# Altium footprint library Cty1.PcbLib: 870 footprints (part 20 of 55)
Each footprint in its own frame and in the unit in brackets; x right, y up, seen from the top. Pads: shape width x height; smd on the part's side, far side on the other; paste and mask are expansions set on the pad; w line width, h text height; cw(c..) or ccw(c..) is an arc to the next point about the centre after c.
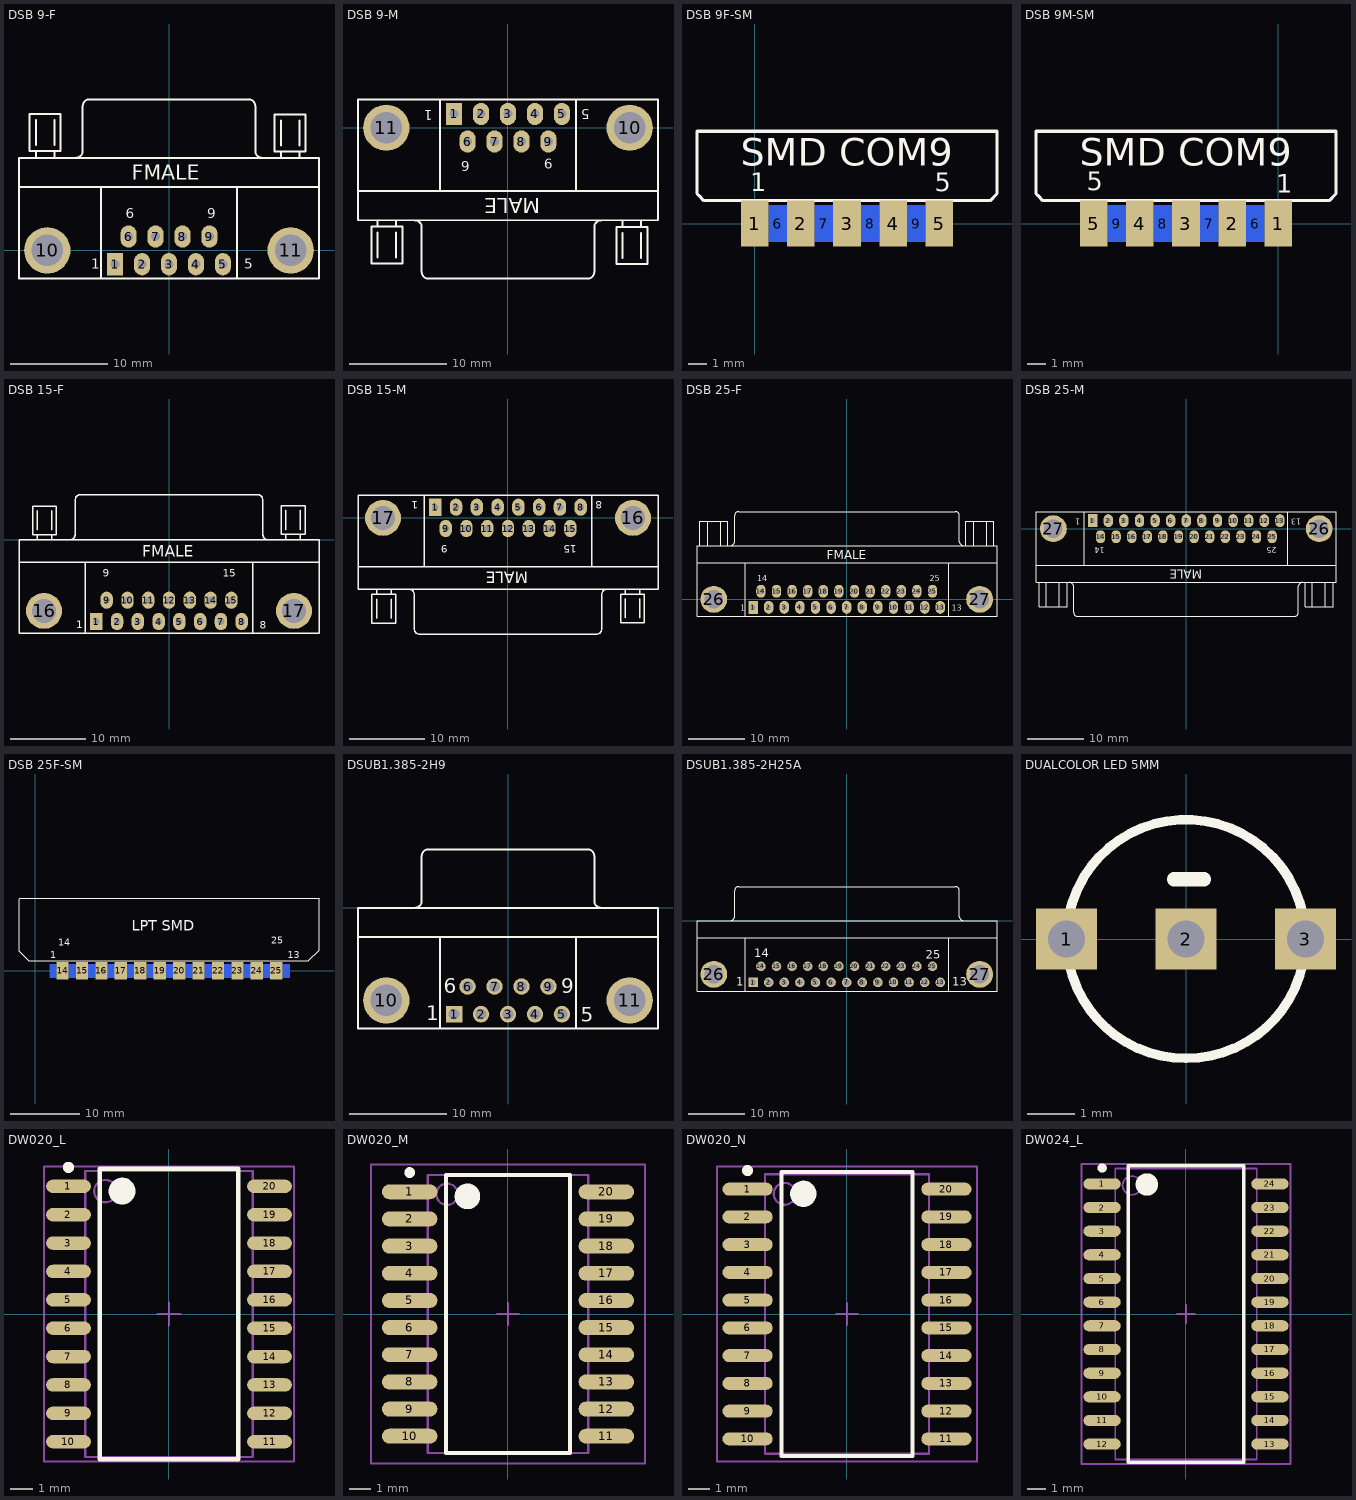
[diagram p19: the footprints below, top view; thin cyan lines are the x and y axes]

## DSB 9-F [mil] "COM FMALE - D Subminiature; 9 Position; Right Angle; Pitch 1.385 mm"
height 501.97
pads (11):
  rect 65x90 hole 35: 1(-218.11,-55.91)
  oval 65x90 hole 35: 2(-109.06,-55.91) 3(0,-55.91) 4(109.06,-55.91) 5(218.11,-55.91) 6(-163.58,55.91) 7(-54.53,55.91) 8(54.53,55.91) 9(163.58,55.91)
  round 187.4 hole 128.35: 10(-491.93,0) 11(491.93,0)
Top Overlay:
  lines w7.87: -606.3,255.91 606.3,255.91 ; -376.38,374.21 ccw(c-376.38,401.57) -349.02,401.57 -349.02,582.68 ; -348.82,582.87 cw(c-321.46,582.87) -321.46,610.24 321.46,610.24 cw(c321.46,582.87) 348.82,582.87 ; -275.59,-114.17 -275.59,255.91 ; 275.59,-114.17 275.59,255.91 ; 349.02,582.68 349.02,401.57 ccw(c376.38,401.57) 376.38,374.21 ; -606.3,-114.17 -606.3,374.02 606.3,374.02 606.3,-114.17 -606.3,-114.17
  lines w8: -538,376.02 -538,401.02 ; -538,426.02 -538,526.02 ; -463,376.02 -463,401.02 ; -463,426.02 -463,526.02 ; 452,374.02 452,399.02 ; 452,424.02 452,524.02 ; 527,374.02 527,399.02 ; 527,424.02 527,524.02 ; -563,401.02 -438,401.02 -438,551.02 -563,551.02 -563,401.02 ; 427,399.02 552,399.02 552,549.02 427,549.02 427,399.02
  text "1" at -315,-75 h40
  text "5" at 305,-75 h40
  text "9" at 155,130 h40
  text "6" at -175,130 h40
  text "FMALE" at -150,285 h60
3D body "SW3dPS-9-PIN_DSUB-1.STEP": height 494.6, standoff -124.4, extent -604.5,-138 608.5,613

## DSB 9-M [mil] "COM MALE D Subminiature; 9 Position; Right Angle; Pitch 1.385 mm"
height 501.97
pads (11):
  rect 65x90 hole 35: 1(-218.11,55.91)
  oval 65x90 hole 35: 2(-109.05,55.91) 3(0,55.91) 4(109.06,55.91) 5(218.11,55.91) 6(-163.58,-55.91) 7(-54.53,-55.91) 8(54.53,-55.91) 9(163.58,-55.91)
  round 187.4 hole 128.35: 10(491.93,0) 11(-491.93,0)
Top Overlay:
  lines w7.87: -606.3,-255.91 606.3,-255.91 ; -376.38,-374.21 cw(c-376.38,-401.57) -349.02,-401.57 -349.02,-582.68 ; -348.82,-582.87 ccw(c-321.46,-582.87) -321.46,-610.24 321.46,-610.24 ccw(c321.46,-582.87) 348.82,-582.87 ; -275.59,-255.91 -275.59,114.17 ; 275.59,-255.91 275.59,114.17 ; 349.02,-582.68 349.02,-401.57 cw(c376.38,-401.57) 376.38,-374.21 ; -606.3,-374.02 606.3,-374.02 606.3,114.17 -606.3,114.17 -606.3,-374.02
  lines w8: -527,-524.02 -527,-424.02 ; -527,-399.02 -527,-374.02 ; -452,-524.02 -452,-424.02 ; -452,-399.02 -452,-374.02 ; 463,-526.02 463,-426.02 ; 463,-401.02 463,-376.02 ; 538,-526.02 538,-426.02 ; 538,-401.02 538,-376.02 ; -552,-549.02 -427,-549.02 -427,-399.02 -552,-399.02 -552,-549.02 ; 438,-551.02 563,-551.02 563,-401.02 438,-401.02 438,-551.02
  text "6" at -155,-135 h40
  text "9" at 180,-125 h40
  text "5" at 330,75 h40
  text "1" at -305,70 h40
  text "MALE" at 130,-285 h60
3D body "SW3dPS-9-PIN_DSUB.STEP": height 494.6, standoff -124.4, extent -610,-637 606,138

## DSB 9F-SM [mil] "Com 9 chan SMD,F"
pads (11):
  rect 60x100 smd: 1(0,0) 2(100,0) 3(200,0) 4(300,0) 5(400,0)
  rect 39.37x78.74 smd far side: 6(50,0) 7(150,0) 8(250,0) 9(350,0)
  round 1 all layers, no hole: 10(21,144) 11(152,144)
Top Overlay:
  lines w7: -125,65 -120,60 -110,50 435,50 510,50 525,65 525,200 -125,200 -125,100 -125,65
  text "SMD COM9" at -30,125 h60
  text "5" at 390,70 h40
  text "1" at -10,70 h40

## DSB 9M-SM [mil] "Com 9 chan SMD,F"
pads (11):
  rect 60x100 smd: 1(0,0) 2(-100,0) 3(-200,0) 4(-300,0) 5(-400,0)
  rect 39.37x78.74 smd far side: 6(-50,0) 7(-150,0) 8(-250,0) 9(-350,0)
  round 1 all layers, no hole: 10(-379,144) 11(-248,144)
Top Overlay:
  lines w7: -525,65 -520,60 -510,50 35,50 110,50 125,65 125,200 -525,200 -525,100 -525,65
  text "SMD COM9" at -430,125 h60
  text "5" at -415,72 h40
  text "1" at -4,67 h40

## DSB 15-F [mil] "COM FMALE - D Subminiature; 15 Position; Right Angle; Pitch 1.385 mm"
height 501.97
pads (17):
  rect 65x90 hole 35: 1(-381.69,-429.92)
  oval 65x90 hole 35: 2(-272.64,-429.92) 3(-163.58,-429.92) 4(-54.53,-429.92) 5(54.53,-429.92) 6(163.58,-429.92) 7(272.64,-429.92) 8(381.69,-429.92) 9(-327.17,-318.11) 10(-218.11,-318.11) 11(-109.06,-318.11) 12(0,-318.11) 13(109.06,-318.11) 14(218.11,-318.11) 15(327.17,-318.11)
  round 188.98 hole 125.2: 16(-655.91,-374.02) 17(655.91,-374.02)
Top Overlay:
  lines w7.87: -787.4,-118.11 787.4,-118.11 ; -519.49,0.2 ccw(c-519.49,27.56) -492.13,27.56 -492.13,208.66 ; -491.93,208.86 cw(c-464.57,208.86) -464.57,236.22 464.57,236.22 cw(c464.57,208.86) 491.93,208.86 ; -438.58,-492.13 -438.58,-118.11 ; 438.58,-492.13 438.58,-118.11 ; 492.13,208.66 492.13,27.56 ccw(c519.49,27.56) 519.49,0.2 ; -787.4,-492.13 -787.4,0 787.4,0 787.4,-492.13 -787.4,-492.13
  lines w8: -691,1 -691,26 ; -691,51 -691,151 ; -616,1 -616,26 ; -616,51 -616,151 ; 614,3 614,28 ; 614,53 614,153 ; 689,3 689,28 ; 689,53 689,153 ; -716,26 -716,176 -591,176 -591,26 -716,26 ; 589,28 589,178 714,178 714,28 589,28
  text "1" at -488,-466 h40
  text "8" at 476,-469 h40
  text "15" at 282.87,-195.87 h40
  text "9" at -346.85,-195.87 h40
  text "FMALE" at -140,-90 h60
3D body "SW3DPS-DB15RA_F-DEFAULT.STEP": height 494.7, standoff -137.19, extent -778.92,-485.41 780.92,239

## DSB 15-M [mil] "LPT15 MALE - D Subminiature; 15 Position; Right Angle; Pitch 1.385 mm"
height 501.97
pads (17):
  rect 65x90 hole 35: 1(-381.69,55.91)
  oval 65x90 hole 35: 2(-272.64,55.9) 3(-163.58,55.9) 4(-54.53,55.9) 5(54.53,55.9) 6(163.58,55.9) 7(272.64,55.9) 8(381.69,55.9) 9(-327.16,-55.91) 10(-218.11,-55.91) 11(-109.05,-55.91) 12(0,-55.91) 13(109.06,-55.91) 14(218.11,-55.91) 15(327.17,-55.91)
  round 188.98 hole 125.2: 16(655.91,0) 17(-655.91,0)
Top Overlay:
  lines w7.87: -787.4,-255.91 787.4,-255.91 ; -519.49,-374.21 cw(c-519.49,-401.58) -492.13,-401.58 -492.13,-582.68 ; -491.93,-582.87 ccw(c-464.57,-582.87) -464.57,-610.24 464.57,-610.24 ccw(c464.57,-582.87) 491.93,-582.87 ; -438.58,-255.91 -438.58,118.11 ; 438.58,-255.91 438.58,118.11 ; 492.13,-582.68 492.13,-401.58 cw(c519.49,-401.58) 519.49,-374.21 ; -787.4,-374.02 -787.4,118.11 787.4,118.11 787.4,-374.02 -787.4,-374.02
  lines w8: -689,-527.02 -689,-427.02 ; -689,-402.02 -689,-377.02 ; -614,-527.02 -614,-427.02 ; -614,-402.02 -614,-377.02 ; 616,-525.02 616,-425.02 ; 616,-400.02 616,-375.02 ; 691,-525.02 691,-425.02 ; 691,-400.02 691,-375.02 ; -714,-552.02 -589,-552.02 -589,-402.02 -714,-402.02 -714,-552.02 ; 591,-550.02 716,-550.02 716,-400.02 591,-400.02 591,-550.02
  text "1" at -470,85.98 h40
  text "8" at 495,85.98 h40
  text "15" at 360,-144.02 h40
  text "9" at -315,-144.02 h40
  text "MALE" at 105,-284.02 h60
3D body "SW3DPS-DB15RA_M-DEFAULT.STEP": height 494.7, standoff -137.19, extent -775.92,-622.16 783.92,118

## DSB 25-F [mil] "LPT FMALE - D Subminiature; 25 Position; Right Angle; Pitch 1.385 mm"
height 509.06
pads (27):
  rect 65x90 hole 35: 1(-652.2,-55.91)
  oval 65x90 hole 35: 2(-543.5,-55.91) 3(-434.8,-55.91) 4(-326.1,-55.91) 5(-217.4,-55.91) 6(-108.7,-55.91) 7(0,-55.91) 8(108.7,-55.91) 9(217.4,-55.91) 10(326.1,-55.91) 11(434.8,-55.91) 12(543.5,-55.91) 13(652.2,-55.91) 14(-597.85,55.91) 15(-489.15,55.91) 16(-380.45,55.91) 17(-271.75,55.91) 18(-163.05,55.91) 19(-54.35,55.91) 20(54.35,55.91) 21(163.05,55.91) 22(271.75,55.91) 23(380.45,55.91) 24(489.15,55.91) 25(597.85,55.91)
  round 187.4 hole 128.35: 26(-926.22,0) 27(926.22,0)
Top Overlay:
  lines w7.87: -1043.15,255.91 1047.4,255.91 ; -808.7,374.21 ccw(c-808.7,401.57) -781.34,401.57 -781.34,582.68 ; -781.14,582.87 cw(c-753.78,582.87) -753.78,610.24 758.03,610.24 cw(c758.03,582.87) 785.39,582.87 ; -706.54,-118.11 -706.54,255.91 ; 710.79,-118.11 710.79,255.91 ; 785.59,582.68 785.59,401.57 ccw(c812.95,401.57) 812.95,374.21 ; -1043.15,-118.11 -1043.15,374.02 1047.4,374.02 1047.4,-118.11 -1043.15,-118.11
  lines w8: -1023,375.02 -1023,544.02 -828,544.02 -828,375.02 ; -968,375.02 -968,544.02 ; -878,375.02 -878,544.02 ; 830,375.02 830,544.02 1025,544.02 1025,375.02 ; 885,375.02 885,544.02 ; 975,375.02 975,544.02
  text "25" at 578,125.02 h40
  text "14" at -624,125.02 h40
  text "13" at 733,-79.98 h40
  text "1" at -743,-79.98 h40
  text "FMALE" at -140,279.02 h60
3D body "SW3DPS-DB25RA_F-DEFAULT.STEP": height 500.6, standoff -99.4, extent -1054.56,-120 1050.56,604.41

## DSB 25-M [mil] "LPT MALE D Subminiature; 25 Position; Right Angle; Pitch 1.385 mm"
height 509.06
pads (27):
  rect 65x90 hole 35: 1(-652.2,55.91)
  oval 65x90 hole 35: 2(-543.5,55.91) 3(-434.8,55.91) 4(-326.1,55.91) 5(-217.4,55.91) 6(-108.7,55.91) 7(0,55.91) 8(108.7,55.91) 9(217.4,55.91) 10(326.1,55.91) 11(434.8,55.91) 12(543.5,55.91) 13(652.21,55.91) 14(-597.85,-55.91) 15(-489.15,-55.91) 16(-380.45,-55.91) 17(-271.75,-55.91) 18(-163.05,-55.91) 19(-54.35,-55.91) 20(54.35,-55.91) 21(163.05,-55.91) 22(271.75,-55.91) 23(380.45,-55.91) 24(489.15,-55.91) 25(597.85,-55.91)
  round 187.4 hole 128.35: 26(926.22,0) 27(-926.22,0)
Top Overlay:
  lines w7.87: -1047.4,-255.91 1043.15,-255.91 ; -812.95,-374.21 cw(c-812.95,-401.57) -785.59,-401.57 -785.59,-582.68 ; -785.39,-582.87 ccw(c-758.03,-582.87) -758.03,-610.24 753.78,-610.24 ccw(c753.78,-582.87) 781.14,-582.87 ; -710.79,-255.91 -710.79,118.11 ; 706.54,-255.91 706.54,118.11 ; 781.34,-582.68 781.34,-401.57 cw(c808.7,-401.57) 808.7,-374.21 ; -1047.4,-374.02 1043.15,-374.02 1043.15,118.11 -1047.4,118.11 -1047.4,-374.02
  lines w8: -1025,-375.02 -1025,-544.02 -830,-544.02 -830,-375.02 ; -975,-544.02 -975,-375.02 ; -885,-544.02 -885,-375.02 ; 828,-375.02 828,-544.02 1023,-544.02 1023,-375.02 ; 878,-544.02 878,-375.02 ; 968,-544.02 968,-375.02
  text "MALE" at 110,-285 h60
  text "1" at -740,70.98 h40
  text "13" at 800,70.98 h40
  text "14" at -570,-129.02 h40
  text "25" at 630,-129.02 h40
3D body "SW3DPS-DB25RA_M-DEFAULT.STEP": height 500.6, standoff -176.56, extent -1052.56,-606.41 1052.56,118

## DSB 25F-SM [mil] "25 pin, connector LPT"
height 200
pads (27):
  rect 39.37x78.74 smd far side: 1(100,0) 2(211,0) 3(322,0) 4(433,0) 5(544,0) 6(655,0) 7(766,0) 8(877,0) 9(988,0) 10(1099,0) 11(1210,0) 12(1321,0) 13(1432,0)
  rect 70x100 smd: 14(155,0) 15(266,0) 16(377,0) 17(488,0) 18(599,0) 19(710,0) 20(821,0) 21(932,0) 22(1043,0) 23(1154,0) 24(1265,0) 25(1376,0)
  round 1 all layers, no hole: 26(760,80) 27(870,80)
Top Overlay:
  lines w7: -94,112 -39,57 1558,57 1620,119 1620,413 1618,415 1551,415 -89,415 -94,410 -94,112
  text "13" at 1441,73 h40
  text "1" at 85,73 h40
  text "14" at 131,143 h40
  text "25" at 1346,155 h40
  text "LPT SMD" at 550,230 h60

## DSUB1.385-2H9 [mm] "Connector; D Subminiature; 9 Position; Right Angle; Pitch 1.385 mm"
height 12.75
pads (11):
  rect 1.69x1.69 hole 1.09: 1(-5.54,-10.92)
  round 1.69 hole 1.09: 2(-2.77,-10.92) 3(0,-10.92) 4(2.77,-10.92) 5(5.54,-10.92) 6(-4.155,-8.08) 7(-1.385,-8.08) 8(1.385,-8.08) 9(4.155,-8.08)
  round 4.76 hole 3.26: 10(-12.495,-9.5) 11(12.495,-9.5)
Top Overlay:
  lines w0.2: -15.4,-3 15.4,-3 ; -9.56,0.005 ccw(c-9.56,0.7) -8.865,0.7 -8.865,5.3 ; -8.86,5.305 cw(c-8.165,5.305) -8.165,6 8.165,6 cw(c8.165,5.305) 8.86,5.305 ; -7,-12.4 -7,-3 ; 7,-12.4 7,-3 ; 8.865,5.3 8.865,0.7 ccw(c9.56,0.7) 9.56,0.005 ; -15.4,-12.4 -15.4,0 15.4,0 15.4,-12.4 -15.4,-12.4
  text "1" at -8.382,-11.557 h1.5
  text "5" at 7.493,-11.684 h1.5
  text "9" at 5.461,-8.763 h1.5
  text "6" at -6.604,-8.763 h1.5
3D body "D-Sub-K122439109-Stig-Wahlstrom.step": height 12.52, standoff -3.78, extent -15.43,-13.081 15.38,6.119

## DSUB1.385-2H25A [mm] "Connector; D Subminiature; 25 Position; Right Angle; Pitch 1.385 mm"
height 12.93
pads (27):
  rect 1.69x1.69 hole 1.09: 1(-16.566,-10.92)
  round 1.69 hole 1.09: 2(-13.805,-10.92) 3(-11.044,-10.92) 4(-8.283,-10.92) 5(-5.522,-10.92) 6(-2.761,-10.92) 7(0,-10.92) 8(2.761,-10.92) 9(5.522,-10.92) 10(8.283,-10.92) 11(11.044,-10.92) 12(13.805,-10.92) 13(16.566,-10.92) 14(-15.185,-8.08) 15(-12.424,-8.08) 16(-9.663,-8.08) 17(-6.902,-8.08) 18(-4.141,-8.08) 19(-1.38,-8.08) 20(1.381,-8.08) 21(4.142,-8.08) 22(6.903,-8.08) 23(9.664,-8.08) 24(12.425,-8.08) 25(15.186,-8.08)
  round 4.76 hole 3.26: 26(-23.526,-9.5) 27(23.526,-9.5)
Top Overlay:
  lines w0.2: -26.496,-3 26.604,-3 ; -20.541,0.005 ccw(c-20.541,0.7) -19.846,0.7 -19.846,5.3 ; -19.841,5.305 cw(c-19.146,5.305) -19.146,6 19.254,6 cw(c19.254,5.305) 19.949,5.305 ; -17.946,-12.5 -17.946,-3 ; 18.054,-12.5 18.054,-3 ; 19.954,5.3 19.954,0.7 ccw(c20.649,0.7) 20.649,0.005 ; -26.496,-12.5 -26.496,0 26.604,0 26.604,-12.5 -26.496,-12.5
  text "25" at 13.97,-6.731 h1.5
  text "14" at -16.383,-6.477 h1.5
  text "13" at 18.669,-11.557 h1.5
  text "1" at -19.558,-11.557 h1.5
3D body "SW3dPS-d-sub25 connector.STEP": height 12.57, standoff -4.58, extent -26.492,-12.497 26.548,8.003

## DUALCOLOR LED 5MM [mil]
pads (3):
  rect 51.17x51.17 / inner rect 52x52 / far side rect 51.17x51.17 hole 31: 1(-100,0)
  rect 51.17x51.17 / inner round 52 / far side rect 51.17x51.17 hole 31: 2(0,0) 3(100,0)
Top Overlay:
  lines w8: 80.64,59.14 cw(c0,0) 100,0 ; 100,0 ccw(c0,0) -100,0 ccw(c0,0) 0,-100 ccw(c0,0) 100,0
  lines w11.82: -10,50 15,50

## DW020_L [mm] "SOIC, 20-Leads, Body 12.8x7.5mm, Pitch 1.27mm, IPC High Density"
height 2.65
pads (20):
  oval 2x0.6 smd: 1(-4.5,5.715) 2(-4.5,4.445) 3(-4.5,3.175) 4(-4.5,1.905) 5(-4.5,0.635) 6(-4.5,-0.635) 7(-4.5,-1.905) 8(-4.5,-3.175) 9(-4.5,-4.445) 10(-4.5,-5.715) 11(4.5,-5.715) 12(4.5,-4.445) 13(4.5,-3.175) 14(4.5,-1.905) 15(4.5,-0.635) 16(4.5,0.635) 17(4.5,1.905) 18(4.5,3.175) 19(4.5,4.445) 20(4.5,5.715)
Top Overlay:
  circle w0.25: c-4.5,6.565 r0.125
  circle w0.6: c-2.1,5.5 r0.3
  lines w0.2: -3.1,-6.5 -3.1,6.5 3.1,6.5 3.1,-6.5 -3.1,-6.5
Mechanical 13:
  circle w0.1: c-2.85,5.5 r0.5
  lines w0.1: -3.75,-6.4 -3.75,6.4 3.75,6.4 3.75,-6.4 -3.75,-6.4
Mechanical 15:
  lines w0.1: -0.5,0 0.5,0 ; 0,-0.5 0,0.5 ; -5.6,-6.6 -5.6,6.6 5.6,6.6 5.6,-6.6 -5.6,-6.6
3D body: height 2.65, standoff 0, extent -3.75,-6.4 3.75,6.4

## DW020_M [mm] "SOIC, 20-Leads, Body 12.8x7.5mm, Pitch 1.27mm, IPC Low Density"
height 2.65
pads (20):
  oval 2.6x0.7 smd: 1(-4.6,5.715) 2(-4.6,4.445) 3(-4.6,3.175) 4(-4.6,1.905) 5(-4.6,0.635) 6(-4.6,-0.635) 7(-4.6,-1.905) 8(-4.6,-3.175) 9(-4.6,-4.445) 10(-4.6,-5.715) 11(4.6,-5.715) 12(4.6,-4.445) 13(4.6,-3.175) 14(4.6,-1.905) 15(4.6,-0.635) 16(4.6,0.635) 17(4.6,1.905) 18(4.6,3.175) 19(4.6,4.445) 20(4.6,5.715)
Top Overlay:
  circle w0.25: c-4.6,6.615 r0.125
  circle w0.6: c-1.9,5.5 r0.3
  lines w0.2: -2.9,-6.5 -2.9,6.5 2.9,6.5 2.9,-6.5 -2.9,-6.5
Mechanical 13:
  circle w0.1: c-2.85,5.6 r0.5
  lines w0.1: -3.75,-6.5 -3.75,6.5 3.75,6.5 3.75,-6.5 -3.75,-6.5
Mechanical 15:
  lines w0.1: -0.5,0 0.5,0 ; 0,-0.5 0,0.5 ; -6.4,-7 -6.4,7 6.4,7 6.4,-7 -6.4,-7
3D body: height 2.65, standoff 0, extent -3.75,-6.5 3.75,6.5

## DW020_N [mm] "SOIC, 20-Leads, Body 12.8x7.5mm, Pitch 1.27mm, IPC Medium Density"
height 2.65
pads (20):
  oval 2.3x0.6 smd: 1(-4.55,5.715) 2(-4.55,4.445) 3(-4.55,3.175) 4(-4.55,1.905) 5(-4.55,0.635) 6(-4.55,-0.635) 7(-4.55,-1.905) 8(-4.55,-3.175) 9(-4.55,-4.445) 10(-4.55,-5.715) 11(4.55,-5.715) 12(4.55,-4.445) 13(4.55,-3.175) 14(4.55,-1.905) 15(4.55,-0.635) 16(4.55,0.635) 17(4.55,1.905) 18(4.55,3.175) 19(4.55,4.445) 20(4.55,5.715)
Top Overlay:
  circle w0.25: c-4.55,6.565 r0.125
  circle w0.6: c-2,5.5 r0.3
  lines w0.2: -3,-6.5 -3,6.5 3,6.5 3,-6.5 -3,-6.5
Mechanical 13:
  circle w0.1: c-2.85,5.5 r0.5
  lines w0.1: -3.75,-6.4 -3.75,6.4 3.75,6.4 3.75,-6.4 -3.75,-6.4
Mechanical 15:
  lines w0.1: -0.5,0 0.5,0 ; 0,-0.5 0,0.5 ; -5.95,-6.75 -5.95,6.75 5.95,6.75 5.95,-6.75 -5.95,-6.75
3D body: height 2.65, standoff 0, extent -3.75,-6.4 3.75,6.4

## DW024_L [mm] "SOIC, 24-Leads, Body 15.4x7.5mm, Pitch 1.27mm, IPC High Density"
height 2.65
pads (24):
  oval 2x0.6 smd: 1(-4.5,6.985) 2(-4.5,5.715) 3(-4.5,4.445) 4(-4.5,3.175) 5(-4.5,1.905) 6(-4.5,0.635) 7(-4.5,-0.635) 8(-4.5,-1.905) 9(-4.5,-3.175) 10(-4.5,-4.445) 11(-4.5,-5.715) 12(-4.5,-6.985) 13(4.5,-6.985) 14(4.5,-5.715) 15(4.5,-4.445) 16(4.5,-3.175) 17(4.5,-1.905) 18(4.5,-0.635) 19(4.5,0.635) 20(4.5,1.905) 21(4.5,3.175) 22(4.5,4.445) 23(4.5,5.715) 24(4.5,6.985)
Top Overlay:
  circle w0.25: c-4.5,7.835 r0.125
  circle w0.6: c-2.1,6.95 r0.3
  lines w0.2: -3.1,-7.95 -3.1,7.95 3.1,7.95 3.1,-7.95 -3.1,-7.95
Mechanical 13:
  circle w0.1: c-2.9,6.9 r0.5
  lines w0.1: -3.8,-7.8 -3.8,7.8 3.8,7.8 3.8,-7.8 -3.8,-7.8
Mechanical 15:
  lines w0.1: -0.5,0 0.5,0 ; 0,-0.5 0,0.5 ; -5.6,-8.05 -5.6,8.05 5.6,8.05 5.6,-8.05 -5.6,-8.05
3D body: height 2.65, standoff 0, extent -3.8,-7.8 3.8,7.8